# Altium integrated library Samtec 2 mm Pitch Terminal Strips.IntLib: 623 symbols (part 1 of 5) (continued)
## LTMM-115-02-L-D
designator P?
Shrouded Header & Stacker, Through-Hole, Vertical, -55 to 125 degC, 2 mm Pitch, 30-Pin, Male, RoHS; Manufacturer: Samtec; PartNumber: LTMM-115-02-L-D; Pitch: 2 mm; DatasheetVersion: F-214; PackageVersion: AQ, 5/1992; PackageReference: LTMM-115-02-X-D; PackageDescription: LTMM Assembly; Supplier 1: Newark; Supplier Part Number 1: 85T5495; Orientation: Vertical; RoHS: True; Temperature Range: -55 to 125 degC; Mounting Technology: Through-hole; ComponentLink1Description: Manufacturer URL; ComponentLink1URL: http://www.samtec.com; ComponentLink2Description: Datasheet; ComponentLink2URL: http://d2a072wq521u33.cloudfront.net/catalog_english//LTMM.PDF; ComponentLink3Description: Package Specification; ComponentLink3URL: http://www.samtec.com/documents/webfiles/cpdf/LTMM-1XX-XX-XX-D-XX-XX-MKT.pdf
footprint SMTC-LTMM-115-02-X-D (Shrouded Header & Stacker, 2x15 Pins, Vertical, 2mm Pitch, Male)
pins: 1, 2, 3, 4, 5, 6, 7, 8, 9, 10, 11, 12, 13, 14, 15, 16, 17, 18, 19, 20, 21, 22, 23, 24, 25, 26, 27, 28, 29, 30

## LTMM-115-02-L-D-SM
designator P?
Shrouded Header & Stacker, Surface Mount, Vertical, -55 to 125 degC, 2 mm Pitch, 30-Pin, Male, RoHS; Manufacturer: Samtec; PartNumber: LTMM-115-02-L-D-SM; Pitch: 2 mm; DatasheetVersion: F-214; PackageVersion: AQ, 5/1992; PackageReference: LTMM-115-02-X-D-SM; PackageDescription: LTMM Assembly; Supplier 1: Newark; Supplier Part Number 1: 85T5496; Orientation: Vertical; RoHS: True; Temperature Range: -55 to 125 degC; Mounting Technology: Surface Mount; ComponentLink1Description: Manufacturer URL; ComponentLink1URL: http://www.samtec.com; ComponentLink2Description: Datasheet; ComponentLink2URL: http://d2a072wq521u33.cloudfront.net/catalog_english//LTMM.PDF; ComponentLink3Description: Package Specification; ComponentLink3URL: http://www.samtec.com/documents/webfiles/cpdf/LTMM-1XX-XX-XX-D-XX-XX-MKT.pdf
footprint SMTC-LTMM-115-02-X-D-SM (Shrouded Header & Stacker, 2x15 Pins, Vertical, 2mm Pitch, Male)
pins: 1, 2, 3, 4, 5, 6, 7, 8, 9, 10, 11, 12, 13, 14, 15, 16, 17, 18, 19, 20, 21, 22, 23, 24, 25, 26, 27, 28, 29, 30

## LTMM-115-02-T-D
designator P?
Shrouded Header & Stacker, Through-Hole, Vertical, -55 to 105 degC, 2 mm Pitch, 30-Pin, Male, RoHS; Manufacturer: Samtec; PartNumber: LTMM-115-02-T-D; Pitch: 2 mm; DatasheetVersion: F-214; PackageVersion: AQ, 5/1992; PackageReference: LTMM-115-02-X-D; PackageDescription: LTMM Assembly; Supplier 1: Newark; Supplier Part Number 1: 85T5497; Orientation: Vertical; RoHS: True; Temperature Range: -55 to 105 degC; Mounting Technology: Through-hole; ComponentLink1Description: Manufacturer URL; ComponentLink1URL: http://www.samtec.com; ComponentLink2Description: Datasheet; ComponentLink2URL: http://d2a072wq521u33.cloudfront.net/catalog_english//LTMM.PDF; ComponentLink3Description: Package Specification; ComponentLink3URL: http://www.samtec.com/documents/webfiles/cpdf/LTMM-1XX-XX-XX-D-XX-XX-MKT.pdf
footprint SMTC-LTMM-115-02-X-D (Shrouded Header & Stacker, 2x15 Pins, Vertical, 2mm Pitch, Male)
pins: 1, 2, 3, 4, 5, 6, 7, 8, 9, 10, 11, 12, 13, 14, 15, 16, 17, 18, 19, 20, 21, 22, 23, 24, 25, 26, 27, 28, 29, 30

## LTMM-115-02-T-D-SM
designator P?
Shrouded Header & Stacker, Surface Mount, Vertical, -55 to 105 degC, 2 mm Pitch, 30-Pin, Male, RoHS; Manufacturer: Samtec; PartNumber: LTMM-115-02-T-D-SM; Pitch: 2 mm; DatasheetVersion: F-214; PackageVersion: AQ, 5/1992; PackageReference: LTMM-115-02-X-D-SM; PackageDescription: LTMM Assembly; Supplier 1: Newark; Supplier Part Number 1: 85T5499; Orientation: Vertical; RoHS: True; Temperature Range: -55 to 105 degC; Mounting Technology: Surface Mount; ComponentLink1Description: Manufacturer URL; ComponentLink1URL: http://www.samtec.com; ComponentLink2Description: Datasheet; ComponentLink2URL: http://d2a072wq521u33.cloudfront.net/catalog_english//LTMM.PDF; ComponentLink3Description: Package Specification; ComponentLink3URL: http://www.samtec.com/documents/webfiles/cpdf/LTMM-1XX-XX-XX-D-XX-XX-MKT.pdf
footprint SMTC-LTMM-115-02-X-D-SM (Shrouded Header & Stacker, 2x15 Pins, Vertical, 2mm Pitch, Male)
pins: 1, 2, 3, 4, 5, 6, 7, 8, 9, 10, 11, 12, 13, 14, 15, 16, 17, 18, 19, 20, 21, 22, 23, 24, 25, 26, 27, 28, 29, 30

## LTMM-117-02-F-D
designator P?
Shrouded Header & Stacker, Through-Hole, Vertical, -55 to 125 degC, 2 mm Pitch, 34-Pin, Male, RoHS; Manufacturer: Samtec; PartNumber: LTMM-117-02-F-D; Pitch: 2 mm; DatasheetVersion: F-214; PackageVersion: AQ, 5/1992; PackageReference: LTMM-117-02-X-D; PackageDescription: LTMM Assembly; Orientation: Vertical; RoHS: True; Temperature Range: -55 to 125 degC; Mounting Technology: Through-hole; ComponentLink1Description: Manufacturer URL; ComponentLink1URL: http://www.samtec.com; ComponentLink2Description: Datasheet; ComponentLink2URL: http://d2a072wq521u33.cloudfront.net/catalog_english//LTMM.PDF; ComponentLink3Description: Package Specification; ComponentLink3URL: http://www.samtec.com/documents/webfiles/cpdf/LTMM-1XX-XX-XX-D-XX-XX-MKT.pdf
footprint SMTC-LTMM-117-02-X-D (Shrouded Header & Stacker, 2x17 Pins, Vertical, 2mm Pitch, Male)
pins: 1, 2, 3, 4, 5, 6, 7, 8, 9, 10, 11, 12, 13, 14, 15, 16, 17, 18, 19, 20, 21, 22, 23, 24, 25, 26, 27, 28, 29, 30, 31, 32, 33, 34

## LTMM-117-02-F-D-BASIC
designator P?
Shrouded Header & Stacker, Through-Hole, Vertical, -55 to 125 degC, 2 mm Pitch, 34-Pin, Male, RoHS; Manufacturer: Samtec; PartNumber: LTMM-117-02-F-D-BASIC; Pitch: 2 mm; DatasheetVersion: F-214; PackageVersion: AQ, 5/1992; PackageReference: LTMM-117-02-X-D-BASIC; PackageDescription: LTMM Assembly; Orientation: Vertical; RoHS: True; Temperature Range: -55 to 125 degC; Mounting Technology: Through-hole; ComponentLink1Description: Manufacturer URL; ComponentLink1URL: http://www.samtec.com; ComponentLink2Description: Datasheet; ComponentLink2URL: http://d2a072wq521u33.cloudfront.net/catalog_english//LTMM.PDF; ComponentLink3Description: Package Specification; ComponentLink3URL: http://www.samtec.com/documents/webfiles/cpdf/LTMM-1XX-XX-XX-D-XX-XX-MKT.pdf
footprint SMTC-LTMM-117-02-X-D-BASIC (Shrouded Header & Stacker, 2x17 Pins, Vertical, 2mm Pitch, Male)
pins: 1, 2, 3, 4, 5, 6, 7, 8, 9, 10, 11, 12, 13, 14, 15, 16, 17, 18, 19, 20, 21, 22, 23, 24, 25, 26, 27, 28, 29, 30, 31, 32, 33, 34

## LTMM-117-02-F-D-RA
designator P?
Shrouded Header & Stacker, Through-Hole, Right Angle, -55 to 125 degC, 2 mm Pitch, 34-Pin, Male, RoHS; Manufacturer: Samtec; PartNumber: LTMM-117-02-F-D-RA; Pitch: 2 mm; DatasheetVersion: F-214; PackageVersion: AQ, 5/1992; PackageReference: LTMM-117-02-X-D-RA; PackageDescription: LTMM Assembly; Orientation: Right Angle; RoHS: True; Temperature Range: -55 to 125 degC; Mounting Technology: Through-hole; ComponentLink1Description: Manufacturer URL; ComponentLink1URL: http://www.samtec.com; ComponentLink2Description: Datasheet; ComponentLink2URL: http://d2a072wq521u33.cloudfront.net/catalog_english//LTMM.PDF; ComponentLink3Description: Package Specification; ComponentLink3URL: http://www.samtec.com/documents/webfiles/cpdf/LTMM-1XX-XX-XX-D-XX-XX-MKT.pdf
footprint SMTC-LTMM-117-02-X-D-RA (Shrouded Header & Stacker, 2x17 Pins, Right Angle, 2mm Pitch, Male)
pins: 1, 2, 3, 4, 5, 6, 7, 8, 9, 10, 11, 12, 13, 14, 15, 16, 17, 18, 19, 20, 21, 22, 23, 24, 25, 26, 27, 28, 29, 30, 31, 32, 33, 34

## LTMM-117-02-F-D-SM
designator P?
Shrouded Header & Stacker, Surface Mount, Vertical, -55 to 125 degC, 2 mm Pitch, 34-Pin, Male, RoHS; Manufacturer: Samtec; PartNumber: LTMM-117-02-F-D-SM; Pitch: 2 mm; DatasheetVersion: F-214; PackageVersion: AQ, 5/1992; PackageReference: LTMM-117-02-X-D-SM; PackageDescription: LTMM Assembly; Orientation: Vertical; RoHS: True; Temperature Range: -55 to 125 degC; Mounting Technology: Surface Mount; ComponentLink1Description: Manufacturer URL; ComponentLink1URL: http://www.samtec.com; ComponentLink2Description: Datasheet; ComponentLink2URL: http://d2a072wq521u33.cloudfront.net/catalog_english//LTMM.PDF; ComponentLink3Description: Package Specification; ComponentLink3URL: http://www.samtec.com/documents/webfiles/cpdf/LTMM-1XX-XX-XX-D-XX-XX-MKT.pdf
footprint SMTC-LTMM-117-02-X-D-SM (Shrouded Header & Stacker, 2x17 Pins, Vertical, 2mm Pitch, Male)
pins: 1, 2, 3, 4, 5, 6, 7, 8, 9, 10, 11, 12, 13, 14, 15, 16, 17, 18, 19, 20, 21, 22, 23, 24, 25, 26, 27, 28, 29, 30, 31, 32, 33, 34

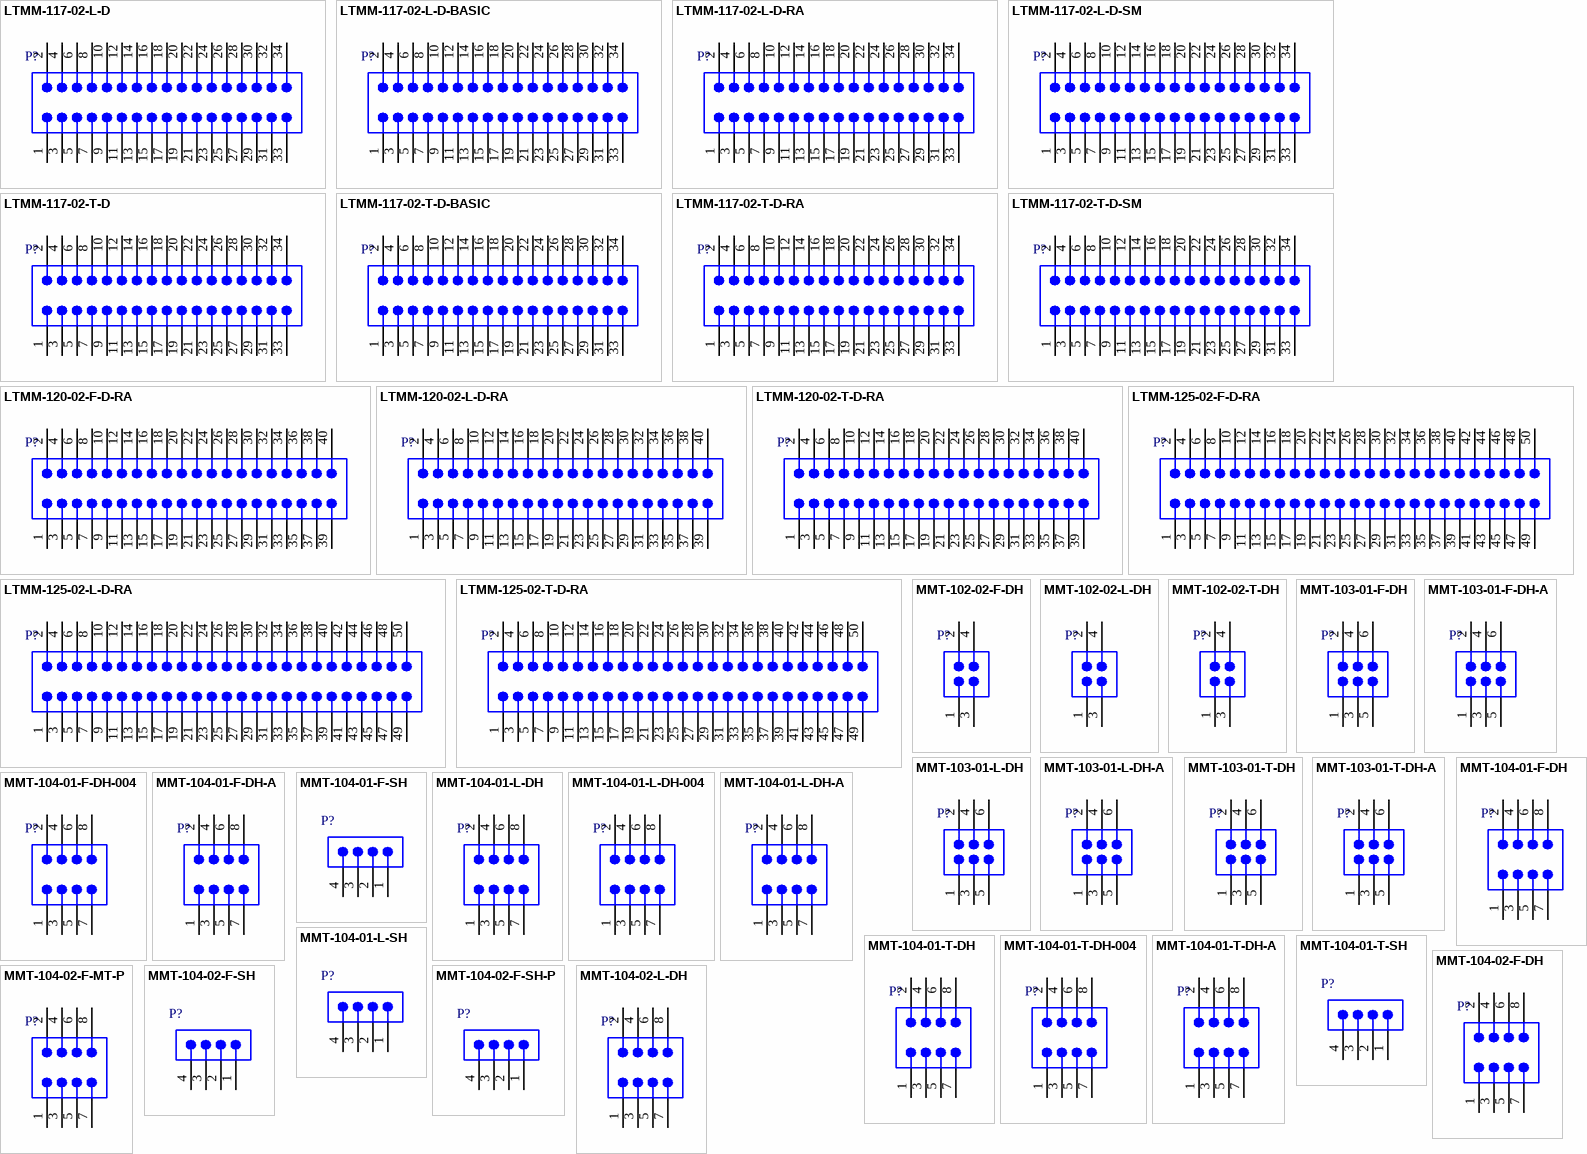
[diagram p1: symbols LTMM-117-02-L-D to MMT-104-02-L-DH]

## LTMM-117-02-L-D
designator P?
Shrouded Header & Stacker, Through-Hole, Vertical, -55 to 125 degC, 2 mm Pitch, 34-Pin, Male, RoHS; Manufacturer: Samtec; PartNumber: LTMM-117-02-L-D; Pitch: 2 mm; DatasheetVersion: F-214; PackageVersion: AQ, 5/1992; PackageReference: LTMM-117-02-X-D; PackageDescription: LTMM Assembly; Supplier 1: Newark; Supplier Part Number 1: 84T0623; Orientation: Vertical; RoHS: True; Temperature Range: -55 to 125 degC; Mounting Technology: Through-hole; ComponentLink1Description: Manufacturer URL; ComponentLink1URL: http://www.samtec.com; ComponentLink2Description: Datasheet; ComponentLink2URL: http://d2a072wq521u33.cloudfront.net/catalog_english//LTMM.PDF; ComponentLink3Description: Package Specification; ComponentLink3URL: http://www.samtec.com/documents/webfiles/cpdf/LTMM-1XX-XX-XX-D-XX-XX-MKT.pdf
footprint SMTC-LTMM-117-02-X-D (Shrouded Header & Stacker, 2x17 Pins, Vertical, 2mm Pitch, Male)
pins: 1, 2, 3, 4, 5, 6, 7, 8, 9, 10, 11, 12, 13, 14, 15, 16, 17, 18, 19, 20, 21, 22, 23, 24, 25, 26, 27, 28, 29, 30, 31, 32, 33, 34

## LTMM-117-02-L-D-BASIC
designator P?
Shrouded Header & Stacker, Through-Hole, Vertical, -55 to 125 degC, 2 mm Pitch, 34-Pin, Male, RoHS; Manufacturer: Samtec; PartNumber: LTMM-117-02-L-D-BASIC; Pitch: 2 mm; DatasheetVersion: F-214; PackageVersion: AQ, 5/1992; PackageReference: LTMM-117-02-X-D-BASIC; PackageDescription: LTMM Assembly; Orientation: Vertical; RoHS: True; Temperature Range: -55 to 125 degC; Mounting Technology: Through-hole; ComponentLink1Description: Manufacturer URL; ComponentLink1URL: http://www.samtec.com; ComponentLink2Description: Datasheet; ComponentLink2URL: http://d2a072wq521u33.cloudfront.net/catalog_english//LTMM.PDF; ComponentLink3Description: Package Specification; ComponentLink3URL: http://www.samtec.com/documents/webfiles/cpdf/LTMM-1XX-XX-XX-D-XX-XX-MKT.pdf
footprint SMTC-LTMM-117-02-X-D-BASIC (Shrouded Header & Stacker, 2x17 Pins, Vertical, 2mm Pitch, Male)
pins: 1, 2, 3, 4, 5, 6, 7, 8, 9, 10, 11, 12, 13, 14, 15, 16, 17, 18, 19, 20, 21, 22, 23, 24, 25, 26, 27, 28, 29, 30, 31, 32, 33, 34

## LTMM-117-02-L-D-RA
designator P?
Shrouded Header & Stacker, Through-Hole, Right Angle, -55 to 125 degC, 2 mm Pitch, 34-Pin, Male, RoHS; Manufacturer: Samtec; PartNumber: LTMM-117-02-L-D-RA; Pitch: 2 mm; DatasheetVersion: F-214; PackageVersion: AQ, 5/1992; PackageReference: LTMM-117-02-X-D-RA; PackageDescription: LTMM Assembly; Supplier 1: Newark; Supplier Part Number 1: 85T5500; Orientation: Right Angle; RoHS: True; Temperature Range: -55 to 125 degC; Mounting Technology: Through-hole; ComponentLink1Description: Manufacturer URL; ComponentLink1URL: http://www.samtec.com; ComponentLink2Description: Datasheet; ComponentLink2URL: http://d2a072wq521u33.cloudfront.net/catalog_english//LTMM.PDF; ComponentLink3Description: Package Specification; ComponentLink3URL: http://www.samtec.com/documents/webfiles/cpdf/LTMM-1XX-XX-XX-D-XX-XX-MKT.pdf
footprint SMTC-LTMM-117-02-X-D-RA (Shrouded Header & Stacker, 2x17 Pins, Right Angle, 2mm Pitch, Male)
pins: 1, 2, 3, 4, 5, 6, 7, 8, 9, 10, 11, 12, 13, 14, 15, 16, 17, 18, 19, 20, 21, 22, 23, 24, 25, 26, 27, 28, 29, 30, 31, 32, 33, 34

## LTMM-117-02-L-D-SM
designator P?
Shrouded Header & Stacker, Surface Mount, Vertical, -55 to 125 degC, 2 mm Pitch, 34-Pin, Male, RoHS; Manufacturer: Samtec; PartNumber: LTMM-117-02-L-D-SM; Pitch: 2 mm; DatasheetVersion: F-214; PackageVersion: AQ, 5/1992; PackageReference: LTMM-117-02-X-D-SM; PackageDescription: LTMM Assembly; Orientation: Vertical; RoHS: True; Temperature Range: -55 to 125 degC; Mounting Technology: Surface Mount; ComponentLink1Description: Manufacturer URL; ComponentLink1URL: http://www.samtec.com; ComponentLink2Description: Datasheet; ComponentLink2URL: http://d2a072wq521u33.cloudfront.net/catalog_english//LTMM.PDF; ComponentLink3Description: Package Specification; ComponentLink3URL: http://www.samtec.com/documents/webfiles/cpdf/LTMM-1XX-XX-XX-D-XX-XX-MKT.pdf
footprint SMTC-LTMM-117-02-X-D-SM (Shrouded Header & Stacker, 2x17 Pins, Vertical, 2mm Pitch, Male)
pins: 1, 2, 3, 4, 5, 6, 7, 8, 9, 10, 11, 12, 13, 14, 15, 16, 17, 18, 19, 20, 21, 22, 23, 24, 25, 26, 27, 28, 29, 30, 31, 32, 33, 34

## LTMM-117-02-T-D
designator P?
Shrouded Header & Stacker, Through-Hole, Vertical, -55 to 105 degC, 2 mm Pitch, 34-Pin, Male, RoHS; Manufacturer: Samtec; PartNumber: LTMM-117-02-T-D; Pitch: 2 mm; DatasheetVersion: F-214; PackageVersion: AQ, 5/1992; PackageReference: LTMM-117-02-X-D; PackageDescription: LTMM Assembly; Supplier 1: Newark; Supplier Part Number 1: 85T5501; Orientation: Vertical; RoHS: True; Temperature Range: -55 to 105 degC; Mounting Technology: Through-hole; ComponentLink1Description: Manufacturer URL; ComponentLink1URL: http://www.samtec.com; ComponentLink2Description: Datasheet; ComponentLink2URL: http://d2a072wq521u33.cloudfront.net/catalog_english//LTMM.PDF; ComponentLink3Description: Package Specification; ComponentLink3URL: http://www.samtec.com/documents/webfiles/cpdf/LTMM-1XX-XX-XX-D-XX-XX-MKT.pdf
footprint SMTC-LTMM-117-02-X-D (Shrouded Header & Stacker, 2x17 Pins, Vertical, 2mm Pitch, Male)
pins: 1, 2, 3, 4, 5, 6, 7, 8, 9, 10, 11, 12, 13, 14, 15, 16, 17, 18, 19, 20, 21, 22, 23, 24, 25, 26, 27, 28, 29, 30, 31, 32, 33, 34

## LTMM-117-02-T-D-BASIC
designator P?
Shrouded Header & Stacker, Through-Hole, Vertical, -55 to 105 degC, 2 mm Pitch, 34-Pin, Male, RoHS; Manufacturer: Samtec; PartNumber: LTMM-117-02-T-D-BASIC; Pitch: 2 mm; DatasheetVersion: F-214; PackageVersion: AQ, 5/1992; PackageReference: LTMM-117-02-X-D-BASIC; PackageDescription: LTMM Assembly; Orientation: Vertical; RoHS: True; Temperature Range: -55 to 105 degC; Mounting Technology: Through-hole; ComponentLink1Description: Manufacturer URL; ComponentLink1URL: http://www.samtec.com; ComponentLink2Description: Datasheet; ComponentLink2URL: http://d2a072wq521u33.cloudfront.net/catalog_english//LTMM.PDF; ComponentLink3Description: Package Specification; ComponentLink3URL: http://www.samtec.com/documents/webfiles/cpdf/LTMM-1XX-XX-XX-D-XX-XX-MKT.pdf
footprint SMTC-LTMM-117-02-X-D-BASIC (Shrouded Header & Stacker, 2x17 Pins, Vertical, 2mm Pitch, Male)
pins: 1, 2, 3, 4, 5, 6, 7, 8, 9, 10, 11, 12, 13, 14, 15, 16, 17, 18, 19, 20, 21, 22, 23, 24, 25, 26, 27, 28, 29, 30, 31, 32, 33, 34

## LTMM-117-02-T-D-RA
designator P?
Shrouded Header & Stacker, Through-Hole, Right Angle, -55 to 105 degC, 2 mm Pitch, 34-Pin, Male, RoHS; Manufacturer: Samtec; PartNumber: LTMM-117-02-T-D-RA; Pitch: 2 mm; DatasheetVersion: F-214; PackageVersion: AQ, 5/1992; PackageReference: LTMM-117-02-X-D-RA; PackageDescription: LTMM Assembly; Supplier 1: Newark; Supplier Part Number 1: 85T5502; Orientation: Right Angle; RoHS: True; Temperature Range: -55 to 105 degC; Mounting Technology: Through-hole; ComponentLink1Description: Manufacturer URL; ComponentLink1URL: http://www.samtec.com; ComponentLink2Description: Datasheet; ComponentLink2URL: http://d2a072wq521u33.cloudfront.net/catalog_english//LTMM.PDF; ComponentLink3Description: Package Specification; ComponentLink3URL: http://www.samtec.com/documents/webfiles/cpdf/LTMM-1XX-XX-XX-D-XX-XX-MKT.pdf
footprint SMTC-LTMM-117-02-X-D-RA (Shrouded Header & Stacker, 2x17 Pins, Right Angle, 2mm Pitch, Male)
pins: 1, 2, 3, 4, 5, 6, 7, 8, 9, 10, 11, 12, 13, 14, 15, 16, 17, 18, 19, 20, 21, 22, 23, 24, 25, 26, 27, 28, 29, 30, 31, 32, 33, 34

## LTMM-117-02-T-D-SM
designator P?
Shrouded Header & Stacker, Surface Mount, Vertical, -55 to 105 degC, 2 mm Pitch, 34-Pin, Male, RoHS; Manufacturer: Samtec; PartNumber: LTMM-117-02-T-D-SM; Pitch: 2 mm; DatasheetVersion: F-214; PackageVersion: AQ, 5/1992; PackageReference: LTMM-117-02-X-D-SM; PackageDescription: LTMM Assembly; Supplier 1: Newark; Supplier Part Number 1: 85T5503; Orientation: Vertical; RoHS: True; Temperature Range: -55 to 105 degC; Mounting Technology: Surface Mount; ComponentLink1Description: Manufacturer URL; ComponentLink1URL: http://www.samtec.com; ComponentLink2Description: Datasheet; ComponentLink2URL: http://d2a072wq521u33.cloudfront.net/catalog_english//LTMM.PDF; ComponentLink3Description: Package Specification; ComponentLink3URL: http://www.samtec.com/documents/webfiles/cpdf/LTMM-1XX-XX-XX-D-XX-XX-MKT.pdf
footprint SMTC-LTMM-117-02-X-D-SM (Shrouded Header & Stacker, 2x17 Pins, Vertical, 2mm Pitch, Male)
pins: 1, 2, 3, 4, 5, 6, 7, 8, 9, 10, 11, 12, 13, 14, 15, 16, 17, 18, 19, 20, 21, 22, 23, 24, 25, 26, 27, 28, 29, 30, 31, 32, 33, 34

## LTMM-120-02-F-D-RA
designator P?
Shrouded Header & Stacker, Through-Hole, Right Angle, -55 to 125 degC, 2 mm Pitch, 40-Pin, Male, RoHS; Manufacturer: Samtec; PartNumber: LTMM-120-02-F-D-RA; Pitch: 2 mm; DatasheetVersion: F-214; PackageVersion: AQ, 5/1992; PackageReference: LTMM-120-02-X-D-RA; PackageDescription: LTMM Assembly; Orientation: Right Angle; RoHS: True; Temperature Range: -55 to 125 degC; Mounting Technology: Through-hole; ComponentLink1Description: Manufacturer URL; ComponentLink1URL: http://www.samtec.com; ComponentLink2Description: Datasheet; ComponentLink2URL: http://d2a072wq521u33.cloudfront.net/catalog_english//LTMM.PDF; ComponentLink3Description: Package Specification; ComponentLink3URL: http://www.samtec.com/documents/webfiles/cpdf/LTMM-1XX-XX-XX-D-XX-XX-MKT.pdf
footprint SMTC-LTMM-120-02-X-D-RA (Shrouded Header & Stacker, 2x20 Pins, Right Angle, 2mm Pitch, Male)
pins: 1, 2, 3, 4, 5, 6, 7, 8, 9, 10, 11, 12, 13, 14, 15, 16, 17, 18, 19, 20, 21, 22, 23, 24, 25, 26, 27, 28, 29, 30, 31, 32, 33, 34, 35, 36, 37, 38, 39, 40

## LTMM-120-02-L-D-RA
designator P?
Shrouded Header & Stacker, Through-Hole, Right Angle, -55 to 125 degC, 2 mm Pitch, 40-Pin, Male, RoHS; Manufacturer: Samtec; PartNumber: LTMM-120-02-L-D-RA; Pitch: 2 mm; DatasheetVersion: F-214; PackageVersion: AQ, 5/1992; PackageReference: LTMM-120-02-X-D-RA; PackageDescription: LTMM Assembly; Supplier 1: Newark; Supplier Part Number 1: 85T5504; Orientation: Right Angle; RoHS: True; Temperature Range: -55 to 125 degC; Mounting Technology: Through-hole; ComponentLink1Description: Manufacturer URL; ComponentLink1URL: http://www.samtec.com; ComponentLink2Description: Datasheet; ComponentLink2URL: http://d2a072wq521u33.cloudfront.net/catalog_english//LTMM.PDF; ComponentLink3Description: Package Specification; ComponentLink3URL: http://www.samtec.com/documents/webfiles/cpdf/LTMM-1XX-XX-XX-D-XX-XX-MKT.pdf
footprint SMTC-LTMM-120-02-X-D-RA (Shrouded Header & Stacker, 2x20 Pins, Right Angle, 2mm Pitch, Male)
pins: 1, 2, 3, 4, 5, 6, 7, 8, 9, 10, 11, 12, 13, 14, 15, 16, 17, 18, 19, 20, 21, 22, 23, 24, 25, 26, 27, 28, 29, 30, 31, 32, 33, 34, 35, 36, 37, 38, 39, 40

## LTMM-120-02-T-D-RA
designator P?
Shrouded Header & Stacker, Through-Hole, Right Angle, -55 to 105 degC, 2 mm Pitch, 40-Pin, Male, RoHS; Manufacturer: Samtec; PartNumber: LTMM-120-02-T-D-RA; Pitch: 2 mm; DatasheetVersion: F-214; PackageVersion: AQ, 5/1992; PackageReference: LTMM-120-02-X-D-RA; PackageDescription: LTMM Assembly; Supplier 1: Newark; Supplier Part Number 1: 85T5507; Orientation: Right Angle; RoHS: True; Temperature Range: -55 to 105 degC; Mounting Technology: Through-hole; ComponentLink1Description: Manufacturer URL; ComponentLink1URL: http://www.samtec.com; ComponentLink2Description: Datasheet; ComponentLink2URL: http://d2a072wq521u33.cloudfront.net/catalog_english//LTMM.PDF; ComponentLink3Description: Package Specification; ComponentLink3URL: http://www.samtec.com/documents/webfiles/cpdf/LTMM-1XX-XX-XX-D-XX-XX-MKT.pdf
footprint SMTC-LTMM-120-02-X-D-RA (Shrouded Header & Stacker, 2x20 Pins, Right Angle, 2mm Pitch, Male)
pins: 1, 2, 3, 4, 5, 6, 7, 8, 9, 10, 11, 12, 13, 14, 15, 16, 17, 18, 19, 20, 21, 22, 23, 24, 25, 26, 27, 28, 29, 30, 31, 32, 33, 34, 35, 36, 37, 38, 39, 40

## LTMM-125-02-F-D-RA
designator P?
Shrouded Header & Stacker, Through-Hole, Right Angle, -55 to 125 degC, 2 mm Pitch, 50-Pin, Male, RoHS; Manufacturer: Samtec; PartNumber: LTMM-125-02-F-D-RA; Pitch: 2 mm; DatasheetVersion: F-214; PackageVersion: AQ, 5/1992; PackageReference: LTMM-125-02-X-D-RA; PackageDescription: LTMM Assembly; Orientation: Right Angle; RoHS: True; Temperature Range: -55 to 125 degC; Mounting Technology: Through-hole; ComponentLink1Description: Manufacturer URL; ComponentLink1URL: http://www.samtec.com; ComponentLink2Description: Datasheet; ComponentLink2URL: http://d2a072wq521u33.cloudfront.net/catalog_english//LTMM.PDF; ComponentLink3Description: Package Specification; ComponentLink3URL: http://www.samtec.com/documents/webfiles/cpdf/LTMM-1XX-XX-XX-D-XX-XX-MKT.pdf
footprint SMTC-LTMM-125-02-X-D-RA (Shrouded Header & Stacker, 2x25 Pins, Right Angle, 2mm Pitch, Male)
pins: 1, 2, 3, 4, 5, 6, 7, 8, 9, 10, 11, 12, 13, 14, 15, 16, 17, 18, 19, 20, 21, 22, 23, 24, 25, 26, 27, 28, 29, 30, 31, 32, 33, 34, 35, 36, 37, 38, 39, 40, 41, 42, 43, 44, 45, 46, 47, 48, 49, 50

## LTMM-125-02-L-D-RA
designator P?
Shrouded Header & Stacker, Through-Hole, Right Angle, -55 to 125 degC, 2 mm Pitch, 50-Pin, Male, RoHS; Manufacturer: Samtec; PartNumber: LTMM-125-02-L-D-RA; Pitch: 2 mm; DatasheetVersion: F-214; PackageVersion: AQ, 5/1992; PackageReference: LTMM-125-02-X-D-RA; PackageDescription: LTMM Assembly; Supplier 1: Newark; Supplier Part Number 1: 85T5513; Orientation: Right Angle; RoHS: True; Temperature Range: -55 to 125 degC; Mounting Technology: Through-hole; ComponentLink1Description: Manufacturer URL; ComponentLink1URL: http://www.samtec.com; ComponentLink2Description: Datasheet; ComponentLink2URL: http://d2a072wq521u33.cloudfront.net/catalog_english//LTMM.PDF; ComponentLink3Description: Package Specification; ComponentLink3URL: http://www.samtec.com/documents/webfiles/cpdf/LTMM-1XX-XX-XX-D-XX-XX-MKT.pdf
footprint SMTC-LTMM-125-02-X-D-RA (Shrouded Header & Stacker, 2x25 Pins, Right Angle, 2mm Pitch, Male)
pins: 1, 2, 3, 4, 5, 6, 7, 8, 9, 10, 11, 12, 13, 14, 15, 16, 17, 18, 19, 20, 21, 22, 23, 24, 25, 26, 27, 28, 29, 30, 31, 32, 33, 34, 35, 36, 37, 38, 39, 40, 41, 42, 43, 44, 45, 46, 47, 48, 49, 50

## LTMM-125-02-T-D-RA
designator P?
Shrouded Header & Stacker, Through-Hole, Right Angle, -55 to 105 degC, 2 mm Pitch, 50-Pin, Male, RoHS; Manufacturer: Samtec; PartNumber: LTMM-125-02-T-D-RA; Pitch: 2 mm; DatasheetVersion: F-214; PackageVersion: AQ, 5/1992; PackageReference: LTMM-125-02-X-D-RA; PackageDescription: LTMM Assembly; Supplier 1: Newark; Supplier Part Number 1: 85T5515; Orientation: Right Angle; RoHS: True; Temperature Range: -55 to 105 degC; Mounting Technology: Through-hole; ComponentLink1Description: Manufacturer URL; ComponentLink1URL: http://www.samtec.com; ComponentLink2Description: Datasheet; ComponentLink2URL: http://d2a072wq521u33.cloudfront.net/catalog_english//LTMM.PDF; ComponentLink3Description: Package Specification; ComponentLink3URL: http://www.samtec.com/documents/webfiles/cpdf/LTMM-1XX-XX-XX-D-XX-XX-MKT.pdf
footprint SMTC-LTMM-125-02-X-D-RA (Shrouded Header & Stacker, 2x25 Pins, Right Angle, 2mm Pitch, Male)
pins: 1, 2, 3, 4, 5, 6, 7, 8, 9, 10, 11, 12, 13, 14, 15, 16, 17, 18, 19, 20, 21, 22, 23, 24, 25, 26, 27, 28, 29, 30, 31, 32, 33, 34, 35, 36, 37, 38, 39, 40, 41, 42, 43, 44, 45, 46, 47, 48, 49, 50

## MMT-102-02-F-DH
designator P?
Horizontal Surface Mount Header, -55 to 125 degC, 2 mm Pitch, 4-Pin, Male, RoHS; Manufacturer: Samtec; PartNumber: MMT-102-02-F-DH; Pitch: 2 mm; DatasheetVersion: F-214; PackageVersion: CY, 12/2000; PackageReference: MMT-102-02-X-DH; PackageDescription: 2mm Horizontal Terminal Surface Mount Strip ASSEM; Orientation: Horizontal; RoHS: True; Temperature Range: -55 to 125 degC; Mounting Technology: Surface Mount; ComponentLink1Description: Manufacturer URL; ComponentLink1URL: http://www.samtec.com; ComponentLink2Description: Datasheet; ComponentLink2URL: http://d2a072wq521u33.cloudfront.net/catalog_english//MMT_SM.PDF; ComponentLink3Description: Package Specification; ComponentLink3URL: http://www.samtec.com/documents/webfiles/cpdf/MMT-1XX-XX-XX-XX-XX-XXX-X-XX-MKT.pdf
footprint SMTC-MMT-102-02-X-DH (Terminal Surface Mount Strip ASSEM, 2x2 Pins, Horizontal, 2mm Pitch, Male)
pins: 1, 2, 3, 4

## MMT-102-02-L-DH
designator P?
Horizontal Surface Mount Header, -55 to 125 degC, 2 mm Pitch, 4-Pin, Male, RoHS; Manufacturer: Samtec; PartNumber: MMT-102-02-L-DH; Pitch: 2 mm; DatasheetVersion: F-214; PackageVersion: CY, 12/2000; PackageReference: MMT-102-02-X-DH; PackageDescription: 2mm Horizontal Terminal Surface Mount Strip ASSEM; Supplier 1: Newark; Supplier Part Number 1: 85T5640; Orientation: Horizontal; RoHS: True; Temperature Range: -55 to 125 degC; Mounting Technology: Surface Mount; ComponentLink1Description: Manufacturer URL; ComponentLink1URL: http://www.samtec.com; ComponentLink2Description: Datasheet; ComponentLink2URL: http://d2a072wq521u33.cloudfront.net/catalog_english//MMT_SM.PDF; ComponentLink3Description: Package Specification; ComponentLink3URL: http://www.samtec.com/documents/webfiles/cpdf/MMT-1XX-XX-XX-XX-XX-XXX-X-XX-MKT.pdf
footprint SMTC-MMT-102-02-X-DH (Terminal Surface Mount Strip ASSEM, 2x2 Pins, Horizontal, 2mm Pitch, Male)
pins: 1, 2, 3, 4

## MMT-102-02-T-DH
designator P?
Horizontal Surface Mount Header, -55 to 105 degC, 2 mm Pitch, 4-Pin, Male, RoHS; Manufacturer: Samtec; PartNumber: MMT-102-02-T-DH; Pitch: 2 mm; DatasheetVersion: F-214; PackageVersion: CY, 12/2000; PackageReference: MMT-102-02-X-DH; PackageDescription: 2mm Horizontal Terminal Surface Mount Strip ASSEM; Supplier 1: Newark; Supplier Part Number 1: 85T5643; Orientation: Horizontal; RoHS: True; Temperature Range: -55 to 105 degC; Mounting Technology: Surface Mount; ComponentLink1Description: Manufacturer URL; ComponentLink1URL: http://www.samtec.com; ComponentLink2Description: Datasheet; ComponentLink2URL: http://d2a072wq521u33.cloudfront.net/catalog_english//MMT_SM.PDF; ComponentLink3Description: Package Specification; ComponentLink3URL: http://www.samtec.com/documents/webfiles/cpdf/MMT-1XX-XX-XX-XX-XX-XXX-X-XX-MKT.pdf
footprint SMTC-MMT-102-02-X-DH (Terminal Surface Mount Strip ASSEM, 2x2 Pins, Horizontal, 2mm Pitch, Male)
pins: 1, 2, 3, 4

## MMT-103-01-F-DH
designator P?
Horizontal Surface Mount Header, -55 to 125 degC, 2 mm Pitch, 6-Pin, Male, RoHS; Manufacturer: Samtec; PartNumber: MMT-103-01-F-DH; Pitch: 2 mm; DatasheetVersion: F-214; PackageVersion: CY, 12/2000; PackageReference: MMT-103-01-X-DH; PackageDescription: 2mm Horizontal Terminal Surface Mount Strip ASSEM; Orientation: Horizontal; RoHS: True; Temperature Range: -55 to 125 degC; Mounting Technology: Surface Mount; ComponentLink1Description: Manufacturer URL; ComponentLink1URL: http://www.samtec.com; ComponentLink2Description: Datasheet; ComponentLink2URL: http://d2a072wq521u33.cloudfront.net/catalog_english//MMT_SM.PDF; ComponentLink3Description: Package Specification; ComponentLink3URL: http://www.samtec.com/documents/webfiles/cpdf/MMT-1XX-XX-XX-XX-XX-XXX-X-XX-MKT.pdf
footprint SMTC-MMT-103-01-X-DH (Terminal Surface Mount Strip ASSEM, 2x3 Pins, Horizontal, 2mm Pitch, Male)
pins: 1, 2, 3, 4, 5, 6

## MMT-103-01-F-DH-A
designator P?
Horizontal Surface Mount Header, -55 to 125 degC, 2 mm Pitch, 6-Pin, Male, RoHS; Manufacturer: Samtec; PartNumber: MMT-103-01-F-DH-A; Pitch: 2 mm; DatasheetVersion: F-214; PackageVersion: CY, 12/2000; PackageReference: MMT-103-01-X-DH-A; PackageDescription: 2mm Horizontal Terminal Surface Mount Strip ASSEM; Orientation: Horizontal; RoHS: True; Temperature Range: -55 to 125 degC; Mounting Technology: Surface Mount; ComponentLink1Description: Manufacturer URL; ComponentLink1URL: http://www.samtec.com; ComponentLink2Description: Datasheet; ComponentLink2URL: http://d2a072wq521u33.cloudfront.net/catalog_english//MMT_SM.PDF; ComponentLink3Description: Package Specification; ComponentLink3URL: http://www.samtec.com/documents/webfiles/cpdf/MMT-1XX-XX-XX-XX-XX-XXX-X-XX-MKT.pdf
footprint SMTC-MMT-103-01-X-DH-A (Terminal Surface Mount Strip ASSEM, 2x3 Pins, Horizontal, 2mm Pitch, Male)
pins: 1, 2, 3, 4, 5, 6

## MMT-103-01-L-DH
designator P?
Horizontal Surface Mount Header, -55 to 125 degC, 2 mm Pitch, 6-Pin, Male, RoHS; Manufacturer: Samtec; PartNumber: MMT-103-01-L-DH; Pitch: 2 mm; DatasheetVersion: F-214; PackageVersion: CY, 12/2000; PackageReference: MMT-103-01-X-DH; PackageDescription: 2mm Horizontal Terminal Surface Mount Strip ASSEM; Supplier 1: Newark; Supplier Part Number 1: 85T5645; Orientation: Horizontal; RoHS: True; Temperature Range: -55 to 125 degC; Mounting Technology: Surface Mount; ComponentLink1Description: Manufacturer URL; ComponentLink1URL: http://www.samtec.com; ComponentLink2Description: Datasheet; ComponentLink2URL: http://d2a072wq521u33.cloudfront.net/catalog_english//MMT_SM.PDF; ComponentLink3Description: Package Specification; ComponentLink3URL: http://www.samtec.com/documents/webfiles/cpdf/MMT-1XX-XX-XX-XX-XX-XXX-X-XX-MKT.pdf
footprint SMTC-MMT-103-01-X-DH (Terminal Surface Mount Strip ASSEM, 2x3 Pins, Horizontal, 2mm Pitch, Male)
pins: 1, 2, 3, 4, 5, 6

## MMT-103-01-L-DH-A
designator P?
Horizontal Surface Mount Header, -55 to 125 degC, 2 mm Pitch, 6-Pin, Male, RoHS; Manufacturer: Samtec; PartNumber: MMT-103-01-L-DH-A; Pitch: 2 mm; DatasheetVersion: F-214; PackageVersion: CY, 12/2000; PackageReference: MMT-103-01-X-DH-A; PackageDescription: 2mm Horizontal Terminal Surface Mount Strip ASSEM; Orientation: Horizontal; RoHS: True; Temperature Range: -55 to 125 degC; Mounting Technology: Surface Mount; ComponentLink1Description: Manufacturer URL; ComponentLink1URL: http://www.samtec.com; ComponentLink2Description: Datasheet; ComponentLink2URL: http://d2a072wq521u33.cloudfront.net/catalog_english//MMT_SM.PDF; ComponentLink3Description: Package Specification; ComponentLink3URL: http://www.samtec.com/documents/webfiles/cpdf/MMT-1XX-XX-XX-XX-XX-XXX-X-XX-MKT.pdf
footprint SMTC-MMT-103-01-X-DH-A (Terminal Surface Mount Strip ASSEM, 2x3 Pins, Horizontal, 2mm Pitch, Male)
pins: 1, 2, 3, 4, 5, 6

## MMT-103-01-T-DH
designator P?
Horizontal Surface Mount Header, -55 to 105 degC, 2 mm Pitch, 6-Pin, Male, RoHS; Manufacturer: Samtec; PartNumber: MMT-103-01-T-DH; Pitch: 2 mm; DatasheetVersion: F-214; PackageVersion: CY, 12/2000; PackageReference: MMT-103-01-X-DH; PackageDescription: 2mm Horizontal Terminal Surface Mount Strip ASSEM; Supplier 1: Newark; Supplier Part Number 1: 34R2718; Orientation: Horizontal; RoHS: True; Temperature Range: -55 to 105 degC; Mounting Technology: Surface Mount; ComponentLink1Description: Manufacturer URL; ComponentLink1URL: http://www.samtec.com; ComponentLink2Description: Datasheet; ComponentLink2URL: http://d2a072wq521u33.cloudfront.net/catalog_english//MMT_SM.PDF; ComponentLink3Description: Package Specification; ComponentLink3URL: http://www.samtec.com/documents/webfiles/cpdf/MMT-1XX-XX-XX-XX-XX-XXX-X-XX-MKT.pdf
footprint SMTC-MMT-103-01-X-DH (Terminal Surface Mount Strip ASSEM, 2x3 Pins, Horizontal, 2mm Pitch, Male)
pins: 1, 2, 3, 4, 5, 6

## MMT-103-01-T-DH-A
designator P?
Horizontal Surface Mount Header, -55 to 105 degC, 2 mm Pitch, 6-Pin, Male, RoHS; Manufacturer: Samtec; PartNumber: MMT-103-01-T-DH-A; Pitch: 2 mm; DatasheetVersion: F-214; PackageVersion: CY, 12/2000; PackageReference: MMT-103-01-X-DH-A; PackageDescription: 2mm Horizontal Terminal Surface Mount Strip ASSEM; Orientation: Horizontal; RoHS: True; Temperature Range: -55 to 105 degC; Mounting Technology: Surface Mount; ComponentLink1Description: Manufacturer URL; ComponentLink1URL: http://www.samtec.com; ComponentLink2Description: Datasheet; ComponentLink2URL: http://d2a072wq521u33.cloudfront.net/catalog_english//MMT_SM.PDF; ComponentLink3Description: Package Specification; ComponentLink3URL: http://www.samtec.com/documents/webfiles/cpdf/MMT-1XX-XX-XX-XX-XX-XXX-X-XX-MKT.pdf
footprint SMTC-MMT-103-01-X-DH-A (Terminal Surface Mount Strip ASSEM, 2x3 Pins, Horizontal, 2mm Pitch, Male)
pins: 1, 2, 3, 4, 5, 6

## MMT-104-01-F-DH
designator P?
Horizontal Surface Mount Header, -55 to 125 degC, 2 mm Pitch, 8-Pin, Male, RoHS; Manufacturer: Samtec; PartNumber: MMT-104-01-F-DH; Pitch: 2 mm; DatasheetVersion: F-214; PackageVersion: CY, 12/2000; PackageReference: MMT-104-01-X-DH; PackageDescription: 2mm Horizontal Terminal Surface Mount Strip ASSEM; Orientation: Horizontal; RoHS: True; Temperature Range: -55 to 125 degC; Mounting Technology: Surface Mount; ComponentLink1Description: Manufacturer URL; ComponentLink1URL: http://www.samtec.com; ComponentLink2Description: Datasheet; ComponentLink2URL: http://d2a072wq521u33.cloudfront.net/catalog_english//MMT_SM.PDF; ComponentLink3Description: Package Specification; ComponentLink3URL: http://www.samtec.com/documents/webfiles/cpdf/MMT-1XX-XX-XX-XX-XX-XXX-X-XX-MKT.pdf
footprint SMTC-MMT-104-01-X-DH (Terminal Surface Mount Strip ASSEM, 2x4 Pins, Horizontal, 2mm Pitch, Male)
pins: 1, 2, 3, 4, 5, 6, 7, 8
